# Altium footprint library 430 integreted.PcbLib: 281 footprints (part 9 of 18)
Each footprint in its own frame and in the unit in brackets; x right, y up, seen from the top. Pads: shape width x height; smd on the part's side, far side on the other; paste and mask are expansions set on the pad; w line width, h text height; cw(c..) or ccw(c..) is an arc to the next point about the centre after c.
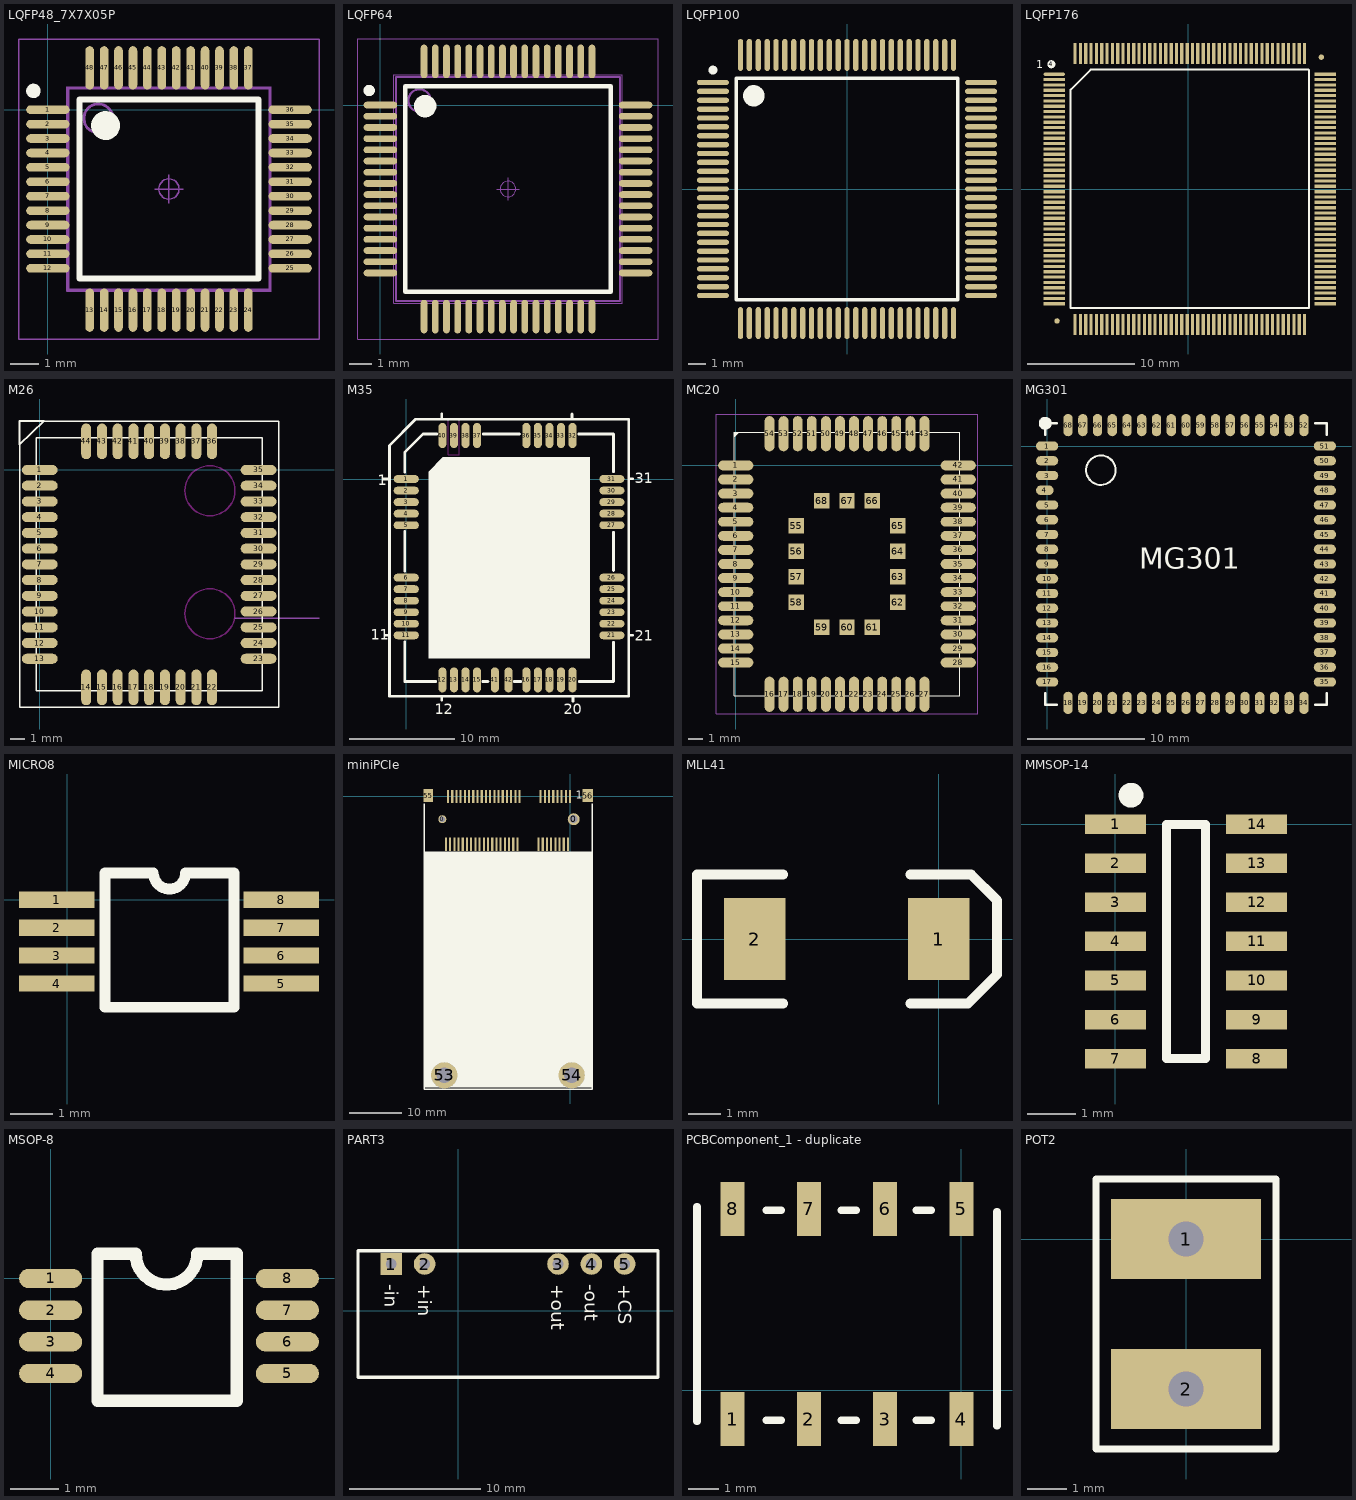
[diagram p8: the footprints below, top view; thin cyan lines are the x and y axes]

## LQFP48_7X7X05P [mm]
pads (48):
  oval 1.5x0.3 smd: 1(0,0) 2(0,-0.5) 3(0,-1) 4(0,-1.5) 5(0,-2) 6(0,-2.5) 7(0,-3) 8(0,-3.5) 9(0,-4) 10(0,-4.5) 11(0,-5) 12(0,-5.5) 25(8.4,-5.5) 26(8.4,-5) 27(8.4,-4.5) 28(8.4,-4) 29(8.4,-3.5) 30(8.4,-3) 31(8.4,-2.5) 32(8.4,-2) 33(8.4,-1.5) 34(8.4,-1) 35(8.4,-0.5) 36(8.4,0)
  oval 0.3x1.5 smd: 13(1.45,-6.95) 14(1.95,-6.95) 15(2.45,-6.95) 16(2.95,-6.95) 17(3.45,-6.95) 18(3.95,-6.95) 19(4.45,-6.95) 20(4.95,-6.95) 21(5.45,-6.95) 22(5.95,-6.95) 23(6.45,-6.95) 24(6.95,-6.95) 37(6.95,1.45) 38(6.45,1.45) 39(5.95,1.45) 40(5.45,1.45) 41(4.95,1.45) 42(4.45,1.45) 43(3.95,1.45) 44(3.45,1.45) 45(2.95,1.45) 46(2.45,1.45) 47(1.95,1.45) 48(1.45,1.45)
Top Overlay:
  circle w0.5: c2,-0.55 r0.25
  circle w0.25: c-0.5,0.65 r0.125
  lines w0.2: 1.1,-5.85 1.1,0.35 7.3,0.35 7.3,-5.85 1.1,-5.85
Mechanical 15:
  circle w0.1: c1.75,-0.3 r0.5
  lines w0.1: 0.7,-6.25 0.7,0.75 7.7,0.75 7.7,-6.25 0.7,-6.25
Mechanical 16:
  circle w0.05: c4.2,-2.75 r0.35
  lines w0.001: 0.65,-6.3 0.65,0.8 7.75,0.8 7.75,-6.3 0.65,-6.3
  lines w0.05: 3.7,-2.75 4.7,-2.75 ; 4.2,-3.25 4.2,-2.25 ; -1,-7.95 -1,2.45 9.4,2.45 9.4,-7.95 -1,-7.95
3D body: height 1.1, standoff 0, extent -0.318,-7.265 8.7,1.753

## LQFP64 [mm]
pads (64):
  oval 1.5x0.3 smd: 1(0,0) 2(0,-0.5) 3(0,-1) 4(0,-1.5) 5(0,-2) 6(0,-2.5) 7(0,-3) 8(0,-3.5) 9(0,-4) 10(0,-4.5) 11(0,-5) 12(0,-5.5) 13(0,-6) 14(0,-6.5) 15(0,-7) 16(0,-7.5) 33(11.4,-7.5) 34(11.4,-7) 35(11.4,-6.5) 36(11.4,-6) 37(11.4,-5.5) 38(11.4,-5) 39(11.4,-4.5) 40(11.4,-4) 41(11.4,-3.5) 42(11.4,-3) 43(11.4,-2.5) 44(11.4,-2) 45(11.4,-1.5) 46(11.4,-1) 47(11.4,-0.5) 48(11.4,0)
  oval 0.3x1.5 smd: 17(1.95,-9.45) 18(2.45,-9.45) 19(2.95,-9.45) 20(3.45,-9.45) 21(3.95,-9.45) 22(4.45,-9.45) 23(4.95,-9.45) 24(5.45,-9.45) 25(5.95,-9.45) 26(6.45,-9.45) 27(6.95,-9.45) 28(7.45,-9.45) 29(7.95,-9.45) 30(8.45,-9.45) 31(8.95,-9.45) 32(9.45,-9.45) 49(9.45,1.95) 50(8.95,1.95) 51(8.45,1.95) 52(7.95,1.95) 53(7.45,1.95) 54(6.95,1.95) 55(6.45,1.95) 56(5.95,1.95) 57(5.45,1.95) 58(4.95,1.95) 59(4.45,1.95) 60(3.95,1.95) 61(3.45,1.95) 62(2.95,1.95) 63(2.45,1.95) 64(1.95,1.95)
Top Overlay:
  circle w0.5: c2,-0.05 r0.25
  circle w0.25: c-0.5,0.65 r0.125
  lines w0.2: 1.1,-8.35 1.1,0.85 10.3,0.85 10.3,-8.35 1.1,-8.35
Mechanical 15:
  circle w0.1: c1.75,0.2 r0.5
  lines w0.1: 0.7,-8.75 0.7,1.25 10.7,1.25 10.7,-8.75 0.7,-8.75
Mechanical 16:
  circle w0.05: c5.7,-3.75 r0.35
  lines w0.001: 0.6,-8.85 0.6,1.35 10.8,1.35 10.8,-8.85 0.6,-8.85
  lines w0.05: 5.2,-3.75 6.2,-3.75 ; 5.7,-4.25 5.7,-3.25 ; -1,-10.45 -1,2.95 12.4,2.95 12.4,-10.45 -1,-10.45

## LQFP100 [mm]
pads (100):
  oval 1.8x0.3 smd: 1(-7.55,6) 2(-7.55,5.5) 3(-7.55,5) 4(-7.55,4.5) 5(-7.55,4) 6(-7.55,3.5) 7(-7.55,3) 8(-7.55,2.5) 9(-7.55,2) 10(-7.55,1.5) 11(-7.55,1) 12(-7.55,0.5) 13(-7.55,0) 14(-7.55,-0.5) 15(-7.55,-1) 16(-7.55,-1.5) 17(-7.55,-2) 18(-7.55,-2.5) 19(-7.55,-3) 20(-7.55,-3.5) 21(-7.55,-4) 22(-7.55,-4.5) 23(-7.55,-5) 24(-7.55,-5.5) 25(-7.55,-6) 51(7.55,-6) 52(7.55,-5.5) 53(7.55,-5) 54(7.55,-4.5) 55(7.55,-4) 56(7.55,-3.5) 57(7.55,-3) 58(7.55,-2.5) 59(7.55,-2) 60(7.55,-1.5) 61(7.55,-1) 62(7.55,-0.5) 63(7.55,0) 64(7.55,0.5) 65(7.55,1) 66(7.55,1.5) 67(7.55,2) 68(7.55,2.5) 69(7.55,3) 70(7.55,3.5) 71(7.55,4) 72(7.55,4.5) 73(7.55,5) 74(7.55,5.5) 75(7.55,6)
  oval 0.3x1.8 smd: 26(-6,-7.55) 27(-5.5,-7.55) 28(-5,-7.55) 29(-4.5,-7.55) 30(-4,-7.55) 31(-3.5,-7.55) 32(-3,-7.55) 33(-2.5,-7.55) 34(-2,-7.55) 35(-1.5,-7.55) 36(-1,-7.55) 37(-0.5,-7.55) 38(0,-7.55) 39(0.5,-7.55) 40(1,-7.55) 41(1.5,-7.55) 42(2,-7.55) 43(2.5,-7.55) 44(3,-7.55) 45(3.5,-7.55) 46(4,-7.55) 47(4.5,-7.55) 48(5,-7.55) 49(5.5,-7.55) 50(6,-7.55) 76(6,7.55) 77(5.5,7.55) 78(5,7.55) 79(4.5,7.55) 80(4,7.55) 81(3.5,7.55) 82(3,7.55) 83(2.5,7.55) 84(2,7.55) 85(1.5,7.55) 86(1,7.55) 87(0.5,7.55) 88(0,7.55) 89(-0.5,7.55) 90(-1,7.55) 91(-1.5,7.55) 92(-2,7.55) 93(-2.5,7.55) 94(-3,7.55) 95(-3.5,7.55) 96(-4,7.55) 97(-4.5,7.55) 98(-5,7.55) 99(-5.5,7.55) 100(-6,7.55)
Top Overlay:
  circle w0.25: c-7.55,6.7 r0.125
  circle w0.6: c-5.25,5.25 r0.3
  lines w0.2: -6.25,-6.25 -6.25,6.25 6.25,6.25 6.25,-6.25 -6.25,-6.25
3D body: height 1.6, standoff 0, extent -7.999,-7.999 8.001,8.001

## LQFP176 [mm]
pads (179):
  oval 2x0.3 smd: 1(-12.556,10.75)
  rect 2x0.3 smd: 2(-12.556,10.25) 3(-12.556,9.75) 4(-12.556,9.25) 5(-12.556,8.75) 6(-12.556,8.25) 7(-12.556,7.75) 8(-12.556,7.25) 9(-12.556,6.75) 10(-12.556,6.25) 11(-12.556,5.75) 12(-12.556,5.25) 13(-12.556,4.75) 14(-12.556,4.25) 15(-12.556,3.75) 16(-12.556,3.25) 17(-12.556,2.75) 18(-12.556,2.25) 19(-12.556,1.75) 20(-12.556,1.25) 21(-12.556,0.75) 22(-12.556,0.25) 23(-12.556,-0.25) 24(-12.556,-0.75) 25(-12.556,-1.25) 26(-12.556,-1.75) 27(-12.556,-2.25) 28(-12.556,-2.75) 29(-12.556,-3.25) 30(-12.556,-3.75) 31(-12.556,-4.25) 32(-12.556,-4.75) 33(-12.556,-5.25) 34(-12.556,-5.75) 35(-12.556,-6.25) 36(-12.556,-6.75) 37(-12.556,-7.25) 38(-12.556,-7.75) 39(-12.556,-8.25) 40(-12.556,-8.75) 41(-12.556,-9.25) 42(-12.556,-9.75) 43(-12.556,-10.25) 44(-12.556,-10.75) 89(12.836,-10.75) 90(12.836,-10.25) 91(12.836,-9.75) 92(12.836,-9.25) 93(12.836,-8.75) 94(12.836,-8.25) 95(12.836,-7.75) 96(12.836,-7.25) 97(12.836,-6.75) 98(12.836,-6.25) 99(12.836,-5.75) 100(12.836,-5.25) 101(12.836,-4.75) 102(12.836,-4.25) 103(12.836,-3.75) 104(12.836,-3.25) 105(12.836,-2.75) 106(12.836,-2.25) 107(12.836,-1.75) 108(12.836,-1.25) 109(12.836,-0.75) 110(12.836,-0.25) 111(12.836,0.25) 112(12.836,0.75) 113(12.836,1.25) 114(12.836,1.75) 115(12.836,2.25) 116(12.836,2.75) 117(12.836,3.25) 118(12.836,3.75) 119(12.836,4.25) 120(12.836,4.75) 121(12.836,5.25) 122(12.836,5.75) 123(12.836,6.25) 124(12.836,6.75) 125(12.836,7.25) 126(12.836,7.75) 127(12.836,8.25) 128(12.836,8.75) 129(12.836,9.25) 130(12.836,9.75) 131(12.836,10.25) 132(12.836,10.75)
  round 0.508 smd: 2(12.463,12.35) 3(-12.302,-12.364)
  round 0.762 on Top Overlay: 4(-12.836,11.69)
  rect 0.3x2 smd: 45(-10.61,-12.696) 46(-10.11,-12.696) 47(-9.61,-12.696) 48(-9.11,-12.696) 49(-8.61,-12.696) 50(-8.11,-12.696) 51(-7.61,-12.696) 52(-7.11,-12.696) 53(-6.61,-12.696) 54(-6.11,-12.696) 55(-5.61,-12.696) 56(-5.11,-12.696) 57(-4.61,-12.696) 58(-4.11,-12.696) 59(-3.61,-12.696) 60(-3.11,-12.696) 61(-2.61,-12.696) 62(-2.11,-12.696) 63(-1.61,-12.696) 64(-1.11,-12.696) 65(-0.61,-12.696) 66(-0.11,-12.696) 67(0.39,-12.696) 68(0.89,-12.696) 69(1.39,-12.696) 70(1.89,-12.696) 71(2.39,-12.696) 72(2.89,-12.696) 73(3.39,-12.696) 74(3.89,-12.696) 75(4.39,-12.696) 76(4.89,-12.696) 77(5.39,-12.696) 78(5.89,-12.696) 79(6.39,-12.696) 80(6.89,-12.696) 81(7.39,-12.696) 82(7.89,-12.696) 83(8.39,-12.696) 84(8.89,-12.696) 85(9.39,-12.696) 86(9.89,-12.696) 87(10.39,-12.696) 88(10.89,-12.696) 133(10.89,12.696) 134(10.39,12.696) 135(9.89,12.696) 136(9.39,12.696) 137(8.89,12.696) 138(8.39,12.696) 139(7.89,12.696) 140(7.39,12.696) 141(6.89,12.696) 142(6.39,12.696) 143(5.89,12.696) 144(5.39,12.696) 145(4.89,12.696) 146(4.39,12.696) 147(3.89,12.696) 148(3.39,12.696) 149(2.89,12.696) 150(2.39,12.696) 151(1.89,12.696) 152(1.39,12.696) 153(0.89,12.696) 154(0.39,12.696) 155(-0.11,12.696) 156(-0.61,12.696) 157(-1.11,12.696) 158(-1.61,12.696) 159(-2.11,12.696) 160(-2.61,12.696) 161(-3.11,12.696) 162(-3.61,12.696) 163(-4.11,12.696) 164(-4.61,12.696) 165(-5.11,12.696) 166(-5.61,12.696) 167(-6.11,12.696) 168(-6.61,12.696) 169(-7.11,12.696) 170(-7.61,12.696) 171(-8.11,12.696) 172(-8.61,12.696) 173(-9.11,12.696) 174(-9.61,12.696) 175(-10.11,12.696) 176(-10.61,12.696)
Top Overlay:
  lines w0.2: 11.269,11.182 -9.153,11.182 -11.025,9.309 -11.025,-11.165 11.305,-11.165 11.305,11.165
  text "1" at -14.274,11.294 h0.76
3D body: height 1.1, standoff 0, extent -12.865,-13.003 13.153,13.015

## M26 [mm]
pads (44):
  oval 2.5x0.7 smd: 1(0,0) 2(0,-1.1) 3(0,-2.2) 4(0,-3.3) 5(0,-4.4) 6(0,-5.5) 7(0,-6.6) 8(0,-7.7) 9(0,-8.8) 10(0,-9.9) 11(0,-11) 12(0,-12.1) 13(0,-13.2) 23(15.3,-13.2) 24(15.3,-12.1) 25(15.3,-11) 26(15.3,-9.9) 27(15.3,-8.8) 28(15.3,-7.7) 29(15.3,-6.6) 30(15.3,-5.5) 31(15.3,-4.4) 32(15.3,-3.3) 33(15.3,-2.2) 34(15.3,-1.1) 35(15.3,0)
  oval 0.7x2.5 smd: 14(3.25,-15.2) 15(4.35,-15.2) 16(5.45,-15.2) 17(6.55,-15.2) 18(7.65,-15.2) 19(8.75,-15.2) 20(9.85,-15.2) 21(10.95,-15.2) 22(12.05,-15.2) 36(12.05,2) 37(10.95,2) 38(9.85,2) 39(8.75,2) 40(7.65,2) 41(6.55,2) 42(5.45,2) 43(4.35,2) 44(3.25,2)
Top Overlay:
  lines w0.1: -1.45,1.752 0.311,3.45 -1.45,3.45 -1.45,1.752 ; -1.4,-16.6 16.7,-16.6 16.7,3.4 -1.4,3.4 -1.4,-16.6 ; -0.25,-15.45 15.55,-15.45 15.55,2.25 -0.25,2.25 -0.25,-15.45
Keep-Out Layer:
  circle w0.1: c11.9,-10.05 r1.75
  circle w0.1: c11.9,-1.45 r1.75
Mechanical 1:
  lines w0.102: 13.65,-10.375 19.525,-10.375
  text "Keepout Area on the Mounted Layer" at 20.2,-10.7 h0.9

## M35 [mm]
pads (42):
  oval 2.4x0.75 smd: 1(0,0) 2(0,-1.1) 3(0,-2.2) 4(0,-3.3) 5(0,-4.4) 6(0,-9.4) 7(0,-10.5) 8(0,-11.6) 9(0,-12.7) 10(0,-13.8) 11(0,-14.9) 21(19.6,-14.9) 22(19.6,-13.8) 23(19.6,-12.7) 24(19.6,-11.6) 25(19.6,-10.5) 26(19.6,-9.4) 27(19.6,-4.4) 28(19.6,-3.3) 29(19.6,-2.2) 30(19.6,-1.1) 31(19.6,0)
  oval 0.75x2.4 smd: 12(3.45,-19.15) 13(4.55,-19.15) 14(5.65,-19.15) 15(6.75,-19.15) 16(11.45,-19.15) 17(12.55,-19.15) 18(13.65,-19.15) 19(14.75,-19.15) 20(15.85,-19.15) 32(15.85,4.15) 33(14.75,4.15) 34(13.65,4.15) 35(12.55,4.15) 36(11.45,4.15) 37(6.75,4.15) 38(5.65,4.15) 39(4.55,4.15) 40(3.45,4.15) 41(8.45,-19.15) 42(9.75,-19.15)
Top Overlay:
  rectangle: 3.5,-17.1 17.5,2.1
  region: 3.509,-0.725 4.916,0.682 3.501,2.096 2.094,0.689
  rectangle: 2.1,-17.1 3.6,0.7
  lines w0.25: -2.2,0 -1.65,0
  lines w0.254: -2,-14.9 -1.65,-14.9 ; -1.6,-20.4 -1.6,3.2 0.9,5.7 6.7,5.7 ; -1.6,-20.2 -1.6,-20.7 21.2,-20.7 21.2,5.7 6.5,5.7 ; -0.15,-15.525 -0.15,-19.3 2.8,-19.3 ; -0.15,-8.775 -0.15,-5 ; -0.15,0.65 -0.15,2.55 1.6,4.3 ; 1.625,4.3 2.9,4.3 ; 3.4,-21.1 3.4,-20.7 ; 3.4,5.8 3.4,6.2 ; 7.3,-19.3 7.8,-19.3 ; 7.35,4.3 10.8,4.3 ; 10.3,-19.3 10.9,-19.3 ; 15.8,5.8 15.8,6.2 ; 15.9,-21.2 15.9,-20.75 ; 16.45,4.3 19.75,4.3 19.75,0.7 ; 16.5,-19.3 19.75,-19.3 19.75,-15.575 ; 19.75,-8.725 19.75,-5.075 ; 21.272,0.036 21.572,0.036 ; 21.35,-14.9 21.6,-14.9
  text "20" at 15,-22.4 h1
  text "31" at 21.8,-0.4 h1
  text "21" at 21.8,-15.4 h1
  text "1" at -2.7,-0.6 h1
  text "11" at -3.4,-15.3 h1
  text "12" at 2.7,-22.4 h1
Keep-Out Layer:
  lines w0.1: 4,2.3 5.05,2.3 5.05,5.7 4,5.7 4,2.3

## MC20 [mm]
pads (68):
  oval 2.5x0.7 smd: 1(0,0) 2(0,-1) 3(0,-2) 4(0,-3) 5(0,-4) 6(0,-5) 7(0,-6) 8(0,-7) 9(0,-8) 10(0,-9) 11(0,-10) 12(0,-11) 13(0,-12) 14(0,-13) 15(0,-14) 28(15.8,-14) 29(15.8,-13) 30(15.8,-12) 31(15.8,-11) 32(15.8,-10) 33(15.8,-9) 34(15.8,-8) 35(15.8,-7) 36(15.8,-6) 37(15.8,-5) 38(15.8,-4) 39(15.8,-3) 40(15.8,-2) 41(15.8,-1) 42(15.8,0)
  oval 0.7x2.5 smd: 16(2.4,-16.25) 17(3.4,-16.25) 18(4.4,-16.25) 19(5.4,-16.25) 20(6.4,-16.25) 21(7.4,-16.25) 22(8.4,-16.25) 23(9.4,-16.25) 24(10.4,-16.25) 25(11.4,-16.25) 26(12.4,-16.25) 27(13.4,-16.25) 43(13.4,2.25) 44(12.4,2.25) 45(11.4,2.25) 46(10.4,2.25) 47(9.4,2.25) 48(8.4,2.25) 49(7.4,2.25) 50(6.4,2.25) 51(5.4,2.25) 52(4.4,2.25) 53(3.4,2.25) 54(2.4,2.25)
  rect 1.1x1.1 smd: 55(4.3,-4.3) 56(4.3,-6.1) 57(4.3,-7.9) 58(4.3,-9.7) 59(6.1,-11.5) 60(7.9,-11.5) 61(9.7,-11.5) 62(11.5,-9.7) 63(11.5,-7.9) 64(11.5,-6.1) 65(11.5,-4.3) 66(9.7,-2.5) 67(7.9,-2.5) 68(6.1,-2.5)
Top Overlay:
  lines w0.01: -0.1,2.05 0.2,2.35 ; -0.1,2.15 0.1,2.35 ; -0.1,2.25 0,2.35 ; -0.1,-16.35 -0.1,2.35 15.9,2.35 15.9,-16.35 -0.1,-16.35
Mechanical 1:
  lines w0.01: -1.4,-17.65 17.2,-17.65 17.2,3.65 -1.4,3.65 -1.4,-17.65

## MG301 [mm]
pads (68):
  oval 1.9x0.8 smd: 1(0,0) 2(0,-1.257) 3(0,-2.514) 5(0,-5.028) 6(0,-6.285) 7(0,-7.542) 8(0,-8.799) 9(0,-10.056) 10(0,-11.313) 11(0,-12.57) 12(0,-13.827) 13(0,-15.084) 14(0,-16.341) 15(0,-17.598) 16(0,-18.855) 17(0,-20.112) 35(23.678,-20.112) 36(23.678,-18.855) 37(23.678,-17.598) 38(23.678,-16.341) 39(23.678,-15.084) 40(23.678,-13.827) 41(23.678,-12.57) 42(23.678,-11.313) 43(23.678,-10.056) 44(23.678,-8.799) 45(23.678,-7.542) 46(23.678,-6.285) 47(23.678,-5.028) 48(23.678,-3.771) 49(23.678,-2.514) 50(23.678,-1.257) 51(23.678,0)
  oval 1.5x0.8 smd: 4(-0.2,-3.771)
  oval 0.8x1.9 smd: 18(1.783,-21.895) 19(3.04,-21.895) 20(4.297,-21.895) 21(5.554,-21.895) 22(6.811,-21.895) 23(8.068,-21.895) 24(9.325,-21.895) 25(10.582,-21.895) 26(11.839,-21.895) 27(13.096,-21.895) 28(14.353,-21.895) 29(15.61,-21.895) 30(16.867,-21.895) 31(18.124,-21.895) 32(19.381,-21.895) 33(20.638,-21.895) 34(21.895,-21.895) 52(21.895,1.783) 53(20.638,1.783) 54(19.381,1.783) 55(18.124,1.783) 56(16.867,1.783) 57(15.61,1.783) 58(14.353,1.783) 59(13.096,1.783) 60(11.839,1.783) 61(10.582,1.783) 62(9.325,1.783) 63(8.068,1.783) 64(6.811,1.783) 65(5.554,1.783) 66(4.297,1.783) 67(3.04,1.783) 68(1.783,1.783)
Top Overlay:
  circle w0.5: c-0.161,1.944 r0.3
  circle w0.178: c4.582,-2.056 r1.257
  lines w0.178: -0.161,-21.056 -0.161,-22.056 0.839,-22.056 ; -0.161,0.944 -0.161,1.944 0.839,1.944 ; 22.839,-22.056 23.839,-22.056 23.839,-21.056 ; 22.839,1.944 23.839,1.944 23.839,0.944
  text "MG301" at 7.839,-11.056 h3.05

## MICRO8 [mil]
pads (8):
  rect 70x15 smd: 1(-10,0) 2(-10,-26) 3(-10,-52) 4(-10,-78) 5(199,-78) 6(199,-52) 7(199,-26) 8(199,0)
Top Overlay:
  lines w10: 34.96,-100.04 34.96,24.96 79.96,24.96 ccw(c94.96,24.96) 109.96,24.96 154.96,24.96 154.96,-100.04 34.96,-100.04

## miniPCIe [mm]
pads (58):
  round 1.524 hole 0.991: 0(-24.3,-4.35)
  round 2.286 hole 1.524: 0(0.7,-4.35)
  rect 0.4x2.5 smd: 1(0,0) 2(-0.4,-9.1) 3(-0.8,0) 4(-1.2,-9.1) 5(-1.6,0) 6(-2,-9.1) 7(-2.4,0) 8(-2.8,-9.1) 9(-3.2,0) 10(-3.6,-9.1) 11(-4,0) 12(-4.4,-9.1) 13(-4.8,0) 14(-5.2,-9.1) 15(-5.6,0) 16(-6,-9.1) 17(-9.6,0) 18(-10,-9.1) 19(-10.4,0) 20(-10.8,-9.1) 21(-11.2,0) 22(-11.6,-9.1) 23(-12,0) 24(-12.4,-9.1) 25(-12.8,0) 26(-13.2,-9.1) 27(-13.6,0) 28(-14,-9.1) 29(-14.4,0) 30(-14.8,-9.1) 31(-15.2,0) 32(-15.6,-9.1) 33(-16,0) 34(-16.4,-9.1) 35(-16.8,0) 36(-17.2,-9.1) 37(-17.6,0) 38(-18,-9.1) 39(-18.4,0) 40(-18.8,-9.1) 41(-19.2,0) 42(-19.6,-9.1) 43(-20,0) 44(-20.4,-9.1) 45(-20.8,0) 46(-21.2,-9.1) 47(-21.6,0) 48(-22,-9.1) 49(-22.4,0) 50(-22.8,-9.1) 51(-23.2,0) 52(-23.6,-9.1)
  round 5 hole 3: 53(-23.92,-53.05) 54(0.316,-53.05)
  rect 1.8x2.5 smd: 55(-26.95,0.15)
  rect 2x2.5 smd: 56(3.35,0.15)
Top Overlay:
  rectangle: -27.698,-55.359 4.052,-10.502
  lines w0.254: -27.772,-34.088 -27.772,-1.44 ; -27.772,-33.952 -27.772,-49.702 -27.772,-55.634 -27.748,-55.658 4.208,-55.658 4.232,-55.634 4.232,-49.7 ; 4.232,-49.702 4.232,-33.952 4.236,-33.952 ; 4.232,-1.44 4.236,-33.95
  text "1" at 1.1,-0.419 h1.52

## MLL41 [mm]
pads (2):
  rect 1.905x2.54 smd: 1(0,0) 2(-5.715,0)
Top Overlay:
  lines w0.305: -4.826,-2 -7.5,-2 -7.5,2 -4.826,2 ; -0.889,-2 0.9,-2 1.8,-1.1 1.8,1.2 1,2 -0.889,2

## MMSOP-14 [mm]
pads (14):
  rect 1.25x0.4 smd: 1(0,0) 2(0,-0.8) 3(0,-1.6) 4(0,-2.4) 5(0,-3.2) 6(0,-4) 7(0,-4.8) 8(2.9,-4.8) 9(2.9,-4) 10(2.9,-3.2) 11(2.9,-2.4) 12(2.9,-1.6) 13(2.9,-0.8) 14(2.9,0)
Top Overlay:
  circle w0.254: c0.323,0.6 r0.127
  lines w0.178: 1.05,-4.8 1.85,-4.8 1.85,0 1.05,0 1.05,-4.8
3D body: height 1.6, standoff 0, extent -0.182,-5.174 3.118,0.426

## MSOP-8 [mm]
pads (8):
  oval 1.3x0.4 smd: 1(0,0) 2(0,-0.652) 3(0,-1.304) 4(0,-1.956) 5(4.877,-1.956) 6(4.877,-1.304) 7(4.877,-0.652) 8(4.877,0)
Top Overlay:
  lines w0.254: 0.965,-2.515 3.835,-2.515 3.835,0.508 3.023,0.508 cw(c2.388,0.508) 1.753,0.508 0.965,0.508 0.965,-2.515
3D body: height 1.05, standoff -0.05, extent -0.03,-2.54 4.907,0.56

## PART3 [mil]
pads (5):
  rect 65x65 hole 32 square: 1(-200,140)
  round 65 hole 32 square: 2(-100,140) 3(300,140) 4(400,140) 5(500,140)
Top Overlay:
  lines w10: -300,-200 -300,180 600,180 600,-200 -300,-200
  text "+CS" at 480,80 h40
  text "-out" at 380,80 h40
  text "+out" at 280,80 h40
  text "-in" at -220,80 h40
  text "+in" at -120,80 h40

## PCBComponent_1 - duplicate [mm]
pads (8):
  rect 0.8x1.8 smd: 1(-7.62,-0.96) 2(-5.08,-0.96) 3(-2.54,-0.96) 4(0,-0.96) 5(0,6.04) 6(-2.54,6.04) 7(-5.08,6.04) 8(-7.62,6.04)
Top Overlay:
  lines w0.254: -8.81,-1.03 -8.81,6.11 ; -6.5,-1 -6,-1 ; -6.5,6 -6,6 ; -4,-1 -3.5,-1 ; -4,6 -3.5,6 ; -1.5,-1 -1,-1 ; -1.5,6 -1,6 ; 1.19,-1.19 1.19,5.95

## POT2 [mil]
pads (2):
  rect 150x80 hole 35: 1(0,0) 2(0,-150)
Top Overlay:
  lines w7: -90,-210 90,-210 90,60 -90,60 -90,-210